# Altium footprint library GyokuRe.PcbLib: 1248 footprints (part 59 of 78)
Each footprint in its own frame and in the unit in brackets; x right, y up, seen from the top. Pads: shape width x height; smd on the part's side, far side on the other; paste and mask are expansions set on the pad; w line width, h text height; cw(c..) or ccw(c..) is an arc to the next point about the centre after c.
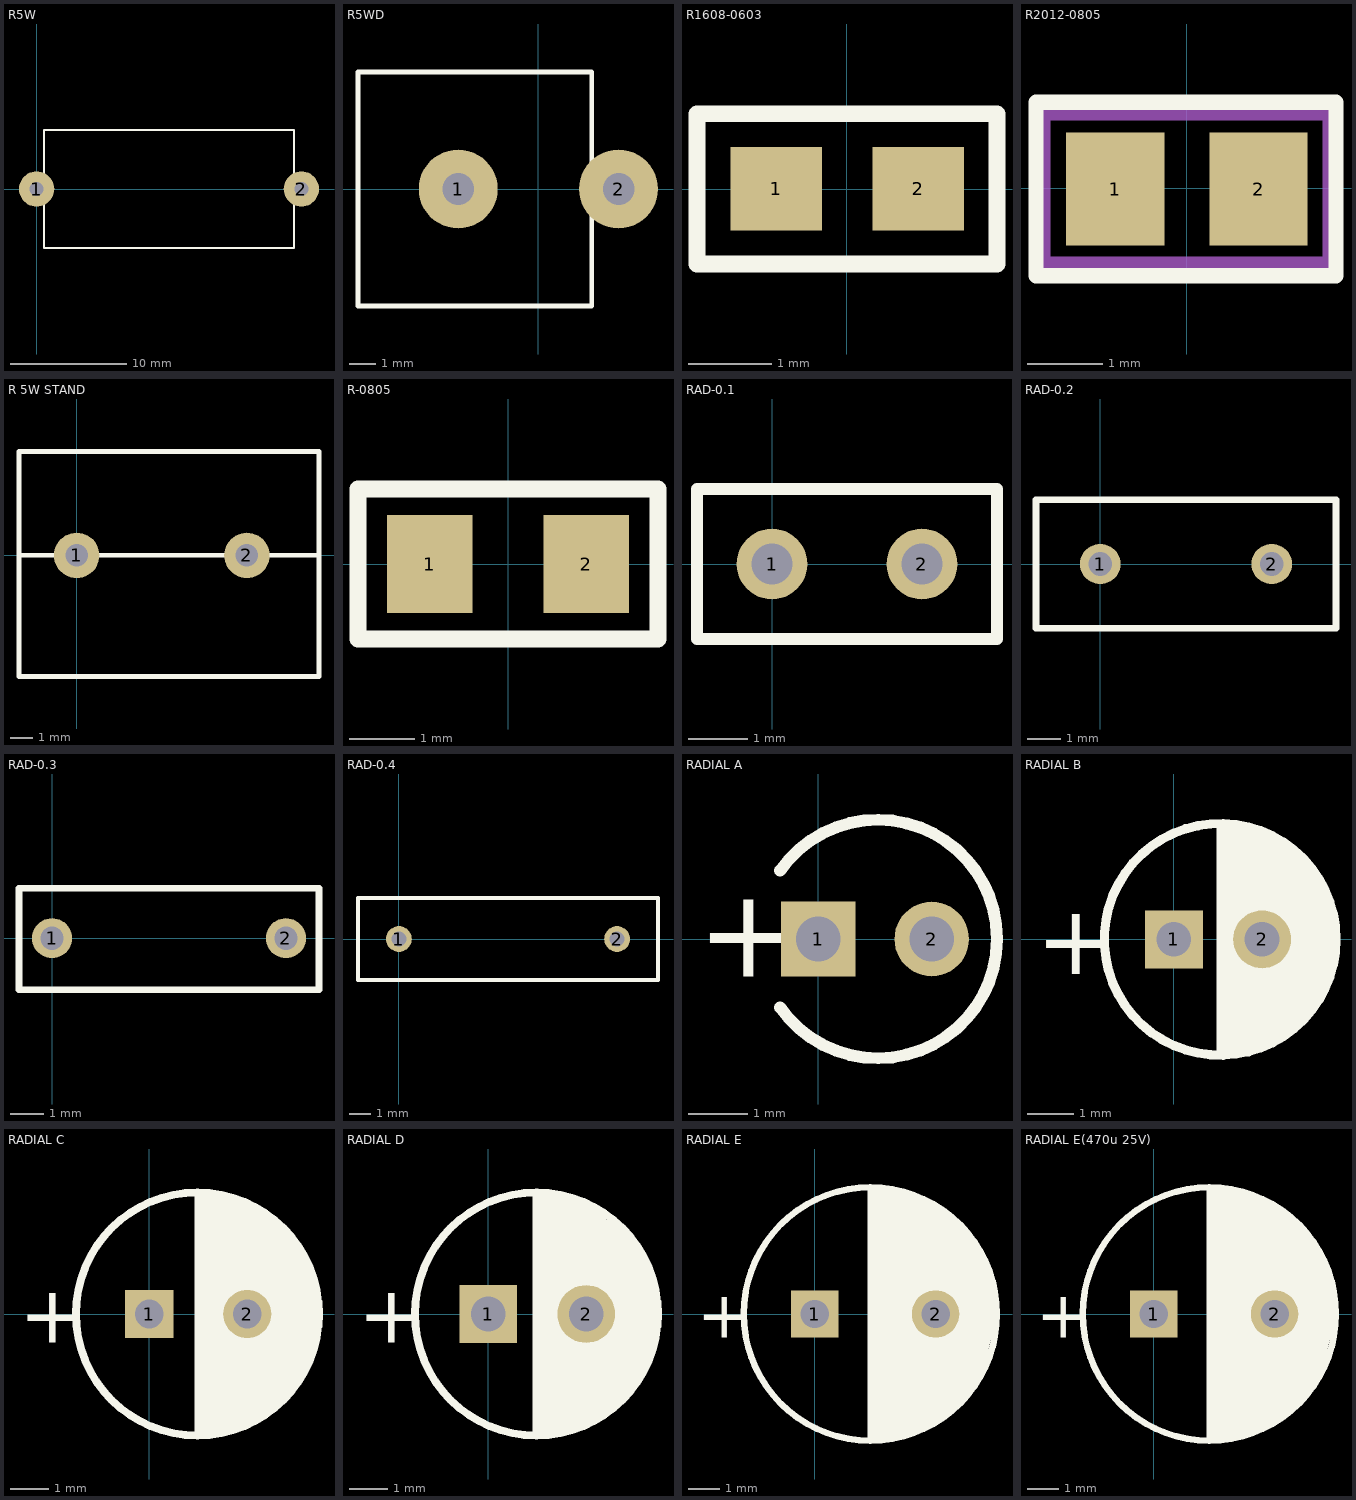
[diagram p58: the footprints below, top view; thin cyan lines are the x and y axes]

## R5W [mil] "R5W , 2 pin, 400 x 950mil"
height 400
pads (2):
  round 120 hole 47.24: 1(0,0) 2(900,0)
Top Overlay:
  lines w7: 25,-200 25,200 875,200 875,-200 25,-200
3D body "User Library-5W Resistor.STEP": height 362.6, standoff -98.43, extent -84.69,-190 954.68,191.89

## R5WD [mm] "R5W , 2 pin, 300 x 600 mil"
height 10.16
pads (2):
  round 3 hole 1.2: 1(-3.048,0) 2(3.048,0)
Top Overlay:
  lines w0.178: -6.858,-4.445 2.032,-4.445 2.032,4.445 -6.858,4.445 -6.858,-4.445
3D body "SW3dPS-5W Res.STEP": height 23.05, standoff -2.4, extent -8.648,-5.08 4.432,4.92

## R1608-0603 [mm] "Resister Chip 0603 package"
pads (2):
  rect 1.1x1 smd: 1(-0.843,0.001) 2(0.857,0.001)
Top Overlay:
  lines w0.2: 1.8,-0.9 1.8,0.9 ; 1.8,-0.899 -1.793,-0.899 -1.793,0.901 1.8,0.901
3D body: height 0.3, standoff 0, extent 0.356,-0.432 0.711,0.432
3D body: height 0.3, standoff 0, extent -0.711,-0.432 -0.356,0.432
3D body: height 0.25, standoff 0, extent -0.356,-0.406 0.356,0.406

## R2012-0805 [mm] "Resister Chip 0805 package"
pads (2):
  rect 1.3x1.5 smd: 1(-0.945,-0.007) 2(0.955,-0.007)
Top Overlay:
  lines w0.2: 1.95,-1.157 -1.995,-1.157 -1.995,1.143 1.975,1.143 ; 1.98,-1.157 1.98,1.143
Mechanical 13:
  lines w0.2: -1.9,-1 -1.9,1 1.9,1 1.9,-1 -1.7,-1 -1.9,-1
3D body: height 0.41, standoff 0, extent -0.889,-0.584 -0.381,0.584
3D body: height 0.41, standoff 0, extent 0.381,-0.584 0.889,0.584
3D body: height 0.38, standoff 0, extent -0.381,-0.572 0.381,0.572

## R 5W STAND [mm]
pads (2):
  round 2 / inner round 1.2 / far side round 2 hole 1: 1(0,0) 2(7.493,0)
Top Overlay:
  lines w0.2: -2.54,0 2,0 10.668,0 ; -2.54,-5.334 -2.54,4.572 10.668,4.572 10.668,-5.334 3.841,-5.334 -2.54,-5.334
3D body "User Library-5W Res.step": height 23.05, standoff -2.4, extent -2.476,-5.428 10.604,4.572

## R-0805 [mm] "Chip Resistor; Body 2.0 x 1.3 mm (LxW typ) [2012]"
height 0.65
pads (2):
  rect 1.3x1.5 smd: 1(-1.194,0) 2(1.194,0)
Top Overlay:
  lines w0.254: -2.286,-1.143 2.286,-1.143 2.286,1.143 -2.286,1.143 -2.286,-1.143
3D body "User Library-Chip Resistor2.STEP": height 0.63, standoff 0, extent -0.95,-0.65 0.95,0.65

## RAD-0.1 [mm] "Cap 200x100 - 100"
pads (2):
  round 1.2 hole 0.7: 1(0,0) 2(2.54,0)
Top Overlay:
  lines w0.2: -1.27,-1.27 -1.27,1.27 3.81,1.27 3.81,-1.27 -1.27,-1.27

## RAD-0.2 [mm] "Cap 350x150 - 200"
pads (2):
  round 1.2 hole 0.7: 1(0,0) 2(5.08,0)
Top Overlay:
  lines w0.2: -1.905,-1.905 6.985,-1.905 6.985,1.905 -1.905,1.905 -1.905,-1.905

## RAD-0.3 [mm] "Cap 450x150 - 300"
height 6
pads (2):
  round 1.2 hole 0.7: 1(0,0) 2(7.01,0)
Top Overlay:
  lines w0.2: -0.991,-1.549 8.001,-1.549 8.001,1.499 -0.991,1.499 -0.991,-1.549
3D body "C104.STEP": height 9.03, standoff -4.16, extent -0.495,-1.219 7.506,1.173

## RAD-0.4 [mm] "Cap 550x150 - 400"
pads (2):
  round 1.2 hole 0.7: 1(0,0) 2(10.16,0)
Top Overlay:
  lines w0.2: -1.905,-1.905 -1.905,1.905 12.065,1.905 12.065,-1.905 -1.905,-1.905

## RADIAL A [mm] "Capacitor, Electrolytic, Radial; Body 4 x 6.8 mm (Dia.xH typ); Pin Spacing 2 mm (typ)"
height 7.8
pads (2):
  rect 1.25x1.25 hole 0.75: 1(0,0)
  round 1.25 hole 0.75: 2(1.905,0)
Top Overlay:
  lines w0.2: -0.638,-1.147 ccw(c1,0) 3,0 ccw(c1,0) -0.638,1.147
  text "+" at -2.032,-0.635 h1.5
Bottom Overlay:
  lines w0.2: -0.638,-1.147 ccw(c1,0) 3,0 ccw(c1,0) -0.638,1.147

## RADIAL B [mm] "Capacitor, Electrolytic, Radial; Body 5 x 6.8 mm (Dia.xH typ); Pin Spacing 2 mm (typ)"
height 7.8
pads (2):
  rect 1.25x1.25 hole 0.75: 1(0,0)
  round 1.25 hole 0.75: 2(1.905,0)
Top Overlay:
  circle w0.2: c1,0 r2.5
  region: 1.041,2.515 2.057,2.286 2.972,1.549 3.429,0.584 3.404,-0.686 2.921,-1.626 2.261,-2.159 1.448,-2.464 1.016,-2.489 1.016,2.489
  lines w0.2: 1.016,-2.464 1.016,2.489
  text "+" at -2.975,-0.75 h1.5
Bottom Overlay:
  circle w0.2: c1,0 r2.5
  text "+" at -2.975,-0.75 h1.5
3D body "Cap 5x11.STEP": height 11, standoff -19, extent -1.484,-2.489 3.516,2.511

## RADIAL C [mm] "Capacitor, Electrolytic, Radial; Body 6.3 x 6.8 mm (Dia.xH typ); Pin Spacing 2.5 mm (typ)"
height 7.8
pads (2):
  rect 1.25x1.25 hole 0.75: 1(0,0)
  round 1.25 hole 0.75: 2(2.54,0)
Top Overlay:
  circle w0.2: c1.25,0 r3.15
  region: 1.27,3.124 2.464,2.921 3.607,2.083 4.293,0.864 4.318,-0.66 3.81,-1.829 2.769,-2.743 2.083,-3.073 1.27,-3.15
  lines w0.2: 1.245,3.124 1.27,3.124 1.27,-3.124
  text "+" at -3.375,-0.75 h1.5
Bottom Overlay:
  circle w0.2: c1.25,0 r3.15
  text "+" at -3.375,-0.75 h1.5
3D body "C radial 254 .step": height 13.7, standoff -1.4, extent -1.27,-2.539 3.808,2.54

## RADIAL D [mm] "Capacitor, Electrolytic, Radial; Body 6.3 x 9.8 mm (Dia.xH typ); Pin Spacing 2.5 mm (typ)"
height 10.8
pads (2):
  rect 1.5x1.5 hole 0.9: 1(0,0)
  round 1.5 hole 0.9: 2(2.54,0)
Top Overlay:
  circle w0.2: c1.25,0 r3.15
  region: 1.219,3.15 2.388,2.946 3.531,2.108 4.242,1.118 4.343,-0.559 3.734,-1.88 2.819,-2.718 1.727,-3.124 1.245,-3.124 1.245,3.124
  lines w0.2: 1.245,-3.15 1.245,3.15 1.27,3.15
  text "+" at -3.375,-0.75 h1.5
Bottom Overlay:
  circle w0.2: c1.25,0 r3.15
  text "+" at -3.375,-0.75 h1.5

## RADIAL E [mm] "Capacitor, Electrolytic, Radial; Body 8 x 10.5 mm (Dia.xH typ); Pin Spacing 3.5 mm (typ)"
height 11.5
pads (2):
  rect 1.5x1.5 hole 0.9: 1(0,0)
  round 1.5 hole 0.9: 2(3.81,0)
Top Overlay:
  circle w0.2: c1.75,0 r4
  region: 1.753,3.988 3.2,3.759 4.597,2.794 5.41,1.651 5.74,-0.051 5.283,-1.854 4.521,-2.921 3.175,-3.785 1.753,-3.988
  lines w0.2: 1.753,-3.988 1.753,3.988 1.778,3.988
  text "+" at -3.725,-0.75 h1.5
Bottom Overlay:
  circle w0.2: c1.75,0 r4
  text "+" at -3.725,-0.75 h1.5
3D body "CAP 8X11_5.STEP": height 11.74, standoff -18.75, extent -2.235,-3.988 5.765,4.012

## RADIAL E(470u 25V) [mm] "Capacitor, Electrolytic, Radial; Body 8 x 10.5 mm (Dia.xH typ); Pin Spacing 3.5 mm (typ)"
height 11.5
pads (2):
  rect 1.5x1.5 hole 0.9: 1(0,0)
  round 1.5 hole 0.9: 2(3.81,0)
Top Overlay:
  circle w0.2: c1.75,0 r4
  region: 1.753,3.988 3.2,3.759 4.597,2.794 5.41,1.651 5.74,-0.051 5.283,-1.854 4.521,-2.921 3.175,-3.785 1.753,-3.988
  lines w0.2: 1.753,-3.988 1.753,3.988 1.778,3.988
  text "+" at -3.725,-0.75 h1.5
Bottom Overlay:
  circle w0.2: c1.75,0 r4
  text "+" at -3.725,-0.75 h1.5
3D body: height 14, standoff 0.1, extent -2.15,-3.9 5.65,3.9
3D body: height 14.1, standoff 0.11, extent -1.25,-3.05 4.775,3.05
3D body: height 14.12, standoff 0.9, extent 4.475,-1.75 5.675,1.55